# Altium footprint library hphonglib.PcbLib: 1250 footprints (part 73 of 79)
Each footprint in its own frame and in the unit in brackets; x right, y up, seen from the top. Pads: shape width x height; smd on the part's side, far side on the other; paste and mask are expansions set on the pad; w line width, h text height; cw(c..) or ccw(c..) is an arc to the next point about the centre after c.
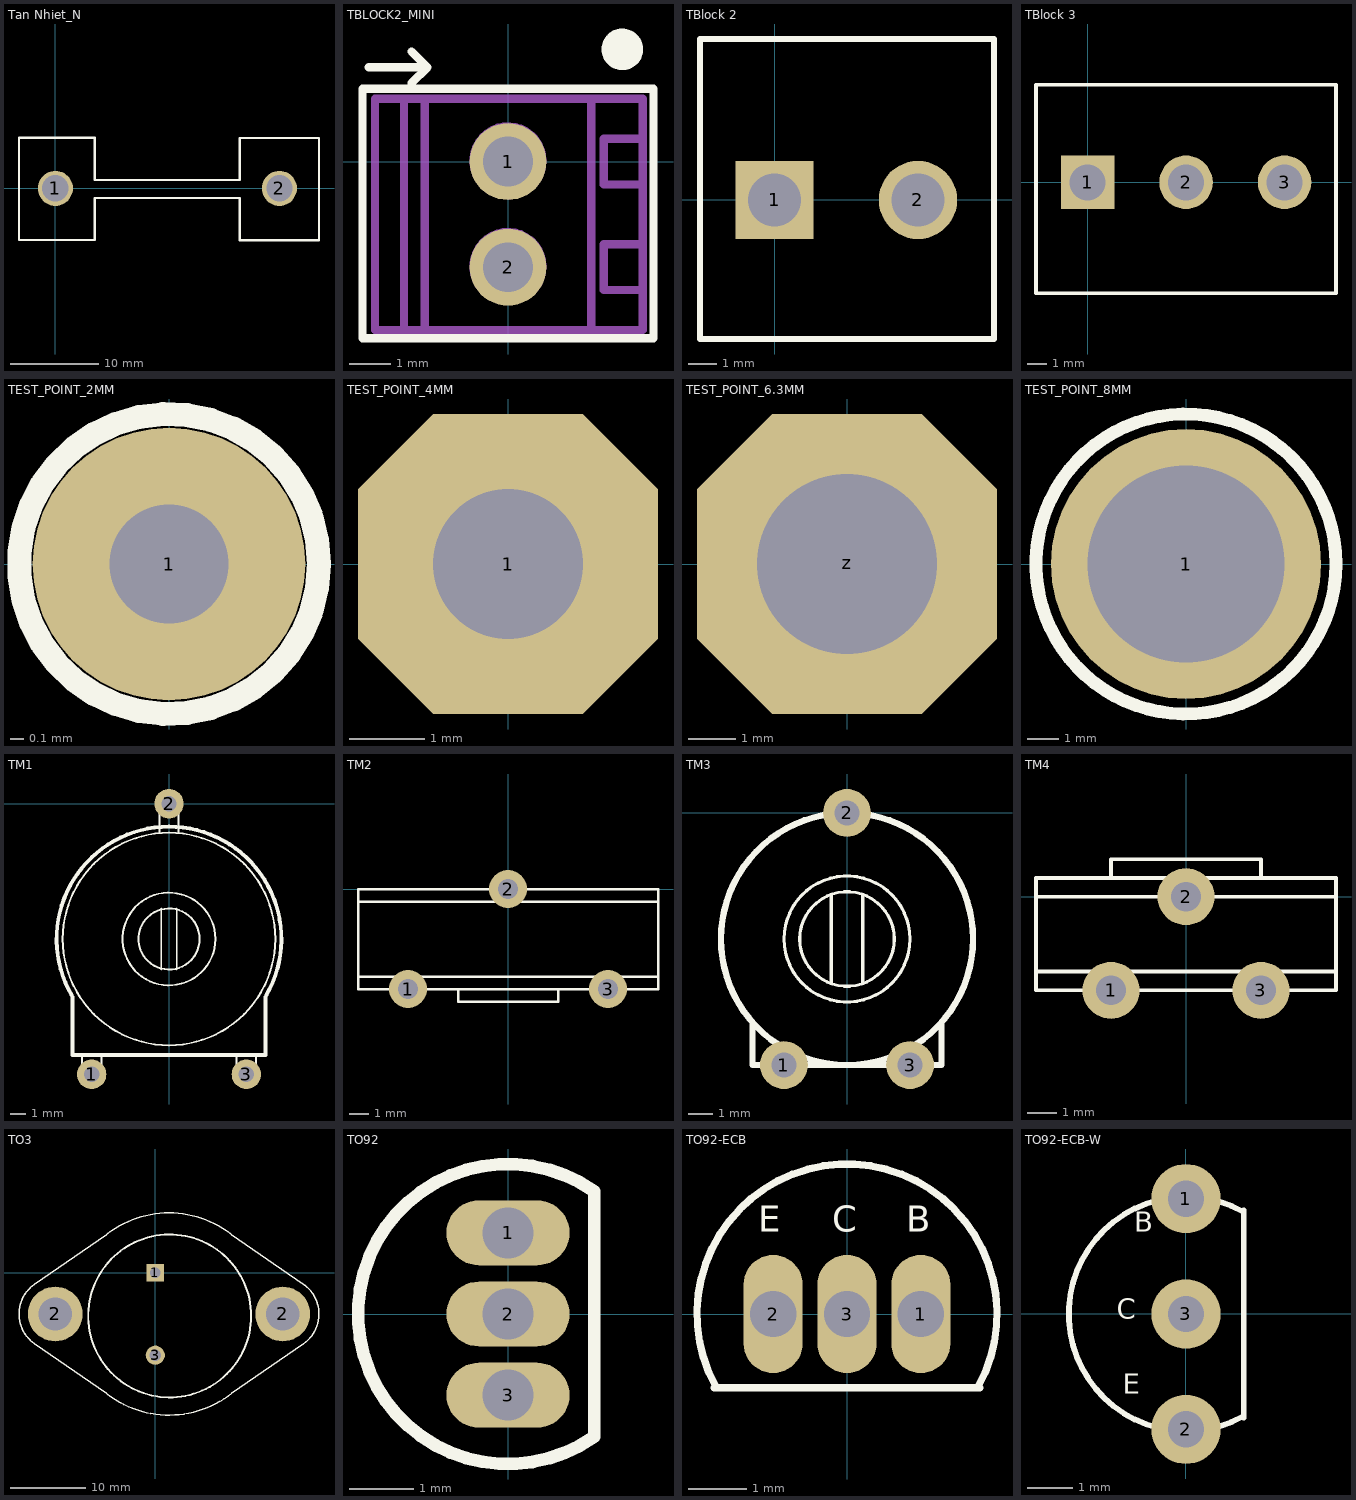
[diagram p72: the footprints below, top view; thin cyan lines are the x and y axes]

## Tan Nhiet_N [mm]
pads (2):
  round 4 hole 3: 1(0,0) 2(25.5,0)
Top Overlay:
  lines w0.254: -4.14,-5.867 4.475,-5.867 4.475,-1.1 20.975,-1.1 20.975,-5.918 30,-5.918 30,5.74 20.975,5.74 20.975,0.95 4.475,0.95 4.475,5.766 -4.14,5.766 -4.14,-5.867
Bottom Overlay:
  circle w0.254: c25.5,0 r1.652
  circle w0.254: c0,0 r1.652
3D body "HeatSink TO220.STEP": height 25, standoff -3.4, extent -4.022,-5.885 29.778,5.715

## TBLOCK2_MINI [mm] "Screw Terminal Strip, 2 Way, 2.54 mm Pitch"
pads (2):
  round 1.85 hole 1.2: 1(0,0) 2(0,-2.54)
Top Overlay:
  circle w0.5: c2.75,2.7 r0.25
  lines w0.2: -3.35,2.27 -1.94,2.27 ; -2.32,1.89 -1.94,2.27 ; -2.32,2.65 -1.94,2.27 ; -3.5,-4.25 3.5,-4.25 3.5,1.75 -3.5,1.75 -3.5,-4.25
Bottom Overlay:
  lines w0.1: -3.48,-4.267 -3.48,1.727 3.48,1.727 3.48,-4.267 -3.48,-4.267
Mechanical 13:
  text ".Designator" at 0.6,-2.925 h2.03
Mechanical 15:
  circle w0.254: c0,0.02 r0.8
  circle w0.254: c0,-2.52 r0.8
  lines w0.2: -2.5,-4.025 -2.5,1.44 ; -2,-4.025 -2,1.5 ; -0.7,-2.1 0.4,-3.2 ; -0.7,0.4 0.3,-0.6 ; -0.2,-1.84 0.7,-2.74 ; -0.2,0.7 0.7,-0.2 ; 2,-4.025 2,1.51 ; 3.2,-3.09 2.3,-3.09 2.3,-1.99 3.2,-1.99 ; 3.2,-0.55 2.3,-0.55 2.3,0.55 3.2,0.55 ; -3.2,1.51 3.24,1.51 3.24,-4.05 -3.198,-4.05 -3.2,1.51
3D body: height 8.5, standoff 4.5, extent -2.7,-4.025 2,1.5
3D body: height 4.5, standoff 0.01, extent -3.2,-4.025 3.25,1.5
3D body: height 2.5, standoff -1, extent -0.55,-3.09 0.55,-1.99
3D body: height 2.5, standoff -1, extent -0.55,-0.55 0.55,0.55
3D body: height 3.5, standoff 1, extent 2.291,-3.284 3.275,-1.774
3D body: height 3.5, standoff 1, extent 2.291,-0.759 3.275,0.751
3D body: height 8.55, standoff 7.6, extent -1.125,-3.565 1.125,-1.515
3D body: height 8.55, standoff 7.6, extent -1.125,-1.025 1.125,1.025
3D body: height 8.6, standoff 7.6, extent 0.129,-3.467 1.029,-1.617
3D body: height 8.6, standoff 7.6, extent -1.021,-3.475 -0.121,-1.625
3D body: height 8.6, standoff 7.6, extent -1.021,-0.925 -0.121,0.925
3D body: height 8.6, standoff 7.6, extent 0.129,-0.917 1.029,0.933

## TBlock 2 [mil] "Connector; Terminal; 2 Positions; Solder Pad 35mil"
pads (2):
  rect 107x107 hole 72: 1(0,0)
  round 107 hole 72: 2(196,0)
Top Overlay:
  lines w7.87: -102,-190 300,-190 300,220 -102,220 -102,-190
3D body "terminal_blocks_a-tb500-ti02.stp": height 560.07, standoff -136.8, extent -121.66,-189 295.67,216.52

## TBlock 3 [mil] "Connector; Terminal; 3 Positions; Solder Pad 35mil"
pads (3):
  rect 107x107 hole 72: 1(0,0)
  round 107 hole 72: 2(197,0) 3(394,0)
Top Overlay:
  lines w7.87: -103,-222 -103,195 497,195 497,-222 -103,-222
3D body "terminal_blocks_a-tb500-ti03.stp": height 120.8, standoff -576.07, extent -98.28,-216 515.9,189.52

## TEST_POINT_2MM [mil] "Test point"
height 150
pads (1):
  round 80 hole 35: 1(0,0)
Top Overlay:
  circle w7: c0,0 r44.01
3D body "socket 1-1.stp": height 178.11, standoff -114.41, extent -50,-50 50,50

## TEST_POINT_4MM [mm] "Test Pad, 1-Pin"
pads (1):
  oct 4x4 hole 2: 1(0,0)

## TEST_POINT_6.3MM [mm] "VIT"
height 0.005
pads (1):
  oct 6.35x6.35 hole 3.81: z(0,0)

## TEST_POINT_8MM [mm] "Jac cap 6ly"
height 3.81
pads (1):
  round 8.5 hole 6.2: 1(0,0)
Top Overlay:
  circle w0.406: c0,0 r4.724

## TM1 [mil]
pads (3):
  round 76 hole 39.37 unplated: 1(-200,-700) 2(0,0) 3(200,-700)
Top Overlay:
  circle w5: c0,-350 r79
  circle w5: c0,-350 r120
  circle w5: c0,-350 r275
  lines w5: -225,-650 -225,-700 -175,-700 -175,-650 ; -25,-75 -25,0 25,0 25,-75 ; -20,-429 -20,-271 ; 20,-429 20,-271 ; 175,-650 175,-700 225,-700 225,-650
  lines w10: -251.79,-495.37 cw(c0,-350) 252.04,-494.93 ; -250,-500 -250,-650 250,-650 250,-500
Bottom Overlay:
  lines w10: -251.79,-495.37 cw(c0,-350) 252.04,-494.93 ; -250,-500 -250,-650 250,-650 250,-500

## TM2 [mil]
pads (3):
  round 76 hole 39.37 unplated: 1(-200,-200) 2(0,0) 3(200,-200)
Top Overlay:
  lines w5: -300,-175 300,-175 ; -300,-25 300,-25 ; -100,-200 -100,-225 100,-225 100,-200 ; -300,-200 -300,0 300,0 300,-200 -300,-200

## TM3 [mil]
pads (3):
  round 76 hole 39.37 unplated: 1(-100,-400) 2(0,0) 3(100,-400)
Top Overlay:
  circle w5: c0,-200 r75
  circle w5: c0,-200 r100
  circle w10: c0,-200 r200
  lines w5: -25,-270 -25,-130 ; 25,-270 25,-130
  lines w10: -150,-335 -150,-400 150,-400 150,-335
Bottom Overlay:
  circle w10: c0,-200 r200
  lines w10: -150,-335 -150,-400 150,-400 150,-335

## TM4 [mil]
pads (3):
  round 76 hole 39.37 unplated: 1(-100,-125) 2(0,0) 3(100,-125)
Top Overlay:
  lines w5: -200,-100 200,-100 ; -200,0 200,0 ; -100,25 -100,50 100,50 100,25 ; -200,-125 200,-125 200,25 -200,25 -200,-125

## TO3 [mm] "Oval Flange Mount with (2) Offset Leads; Pin Spacing 10.92 mm; Lead Dia. 1.09 mm (max)"
height 7.62
pads (4):
  rect 2.3x2.3 hole 1.4: 1(0,0)
  round 7.25 hole 4.4: 2(-13.26,-5.46) 2(16.89,-5.46)
  round 2.54 hole 1.524: 3(0,-10.92)
Top Overlay:
  circle w0.254: c1.905,-5.715 r10.795
  lines w0.2: -16.025,-9.39 -6.484,-15.981 ; -16.025,-1.52 -6.484,5.061 ; -16.013,-9.392 cw(c-13.26,-5.46) -16.013,-1.528 ; -6.798,-15.725 ccw(c1.815,-5.46) 10.113,-15.981 19.635,-9.4 ; -6.798,4.805 cw(c1.815,-5.46) 10.428,4.805 ; 10.114,5.061 19.495,-1.43 ; 19.504,-1.434 cw(c16.89,-5.46) 19.643,-9.392

## TO92 [mil] "TO, Flat Index; 3 In-Line, Axial Leads; Body Dia. 4.6mm; Leads 0.53 x 0.39 mm (max)"
pads (3):
  oval 76x40 hole 31.5: 1(0,50) 2(0,0) 3(0,-50)
Top Overlay:
  lines w7.87: 53.15,-75.59 cw(c0,0) 53.15,75.59 53.15,-75.59
Bottom Overlay:
  lines w7.87: 53.15,-75.59 cw(c0,0) 53.15,75.59 53.15,-75.59
3D body: height 314.96, standoff 157.48, extent -88.58,-88.58 49.21,88.58
3D body: height 196.85, standoff -39.37, extent -11.76,37.4 11.76,60.98
3D body: height 196.85, standoff -39.37, extent -10.78,-11.81 12.75,11.76
3D body: height 196.85, standoff -39.37, extent -11.76,-62.99 11.76,-39.42

## TO92-ECB [mil] "C1815"
pads (3):
  oval 40x80 hole 31.49 unplated: 1(50,0) 2(-50,0) 3(0,0)
Top Overlay:
  lines w5: -90,-50 90,-50 ; -88.94,-49.1 cw(c0,0) 88.94,-49.1
  text "C" at -10,50 h30
  text "B" at 40,50 h30
  text "E" at -60,50 h30
Bottom Overlay:
  lines w5: -90,-50 90,-50 ; -88.94,-49.1 cw(c0,0) 88.94,-49.1
3D body: height 314.96, standoff 157.48, extent -89.57,-48.23 87.6,89.57
3D body: height 196.85, standoff -39.37, extent 36.42,-10.78 59.99,12.75
3D body: height 196.85, standoff -39.37, extent -12.8,-11.76 10.78,11.76
3D body: height 196.85, standoff -39.37, extent -63.98,-10.78 -40.4,12.75

## TO92-ECB-W [mil] "C1815"
pads (3):
  round 60 hole 31.49 unplated: 1(0,100) 2(0,-100) 3(0,0)
Top Overlay:
  lines w5: 49.1,-88.94 cw(c0,0) 49.1,88.94 ; 50,-90 50,90
  text "E" at -55,-75 h30
  text "B" at -45,65 h30
  text "C" at -60,-10 h30
Bottom Overlay:
  lines w5: 49.1,-88.94 cw(c0,0) 49.1,88.94 ; 50,-90 50,90
3D body: height 314.96, standoff 157.48, extent -89.57,-89.57 48.23,87.6
3D body: height 196.85, standoff -39.37, extent -10.83,88.61 12.7,112.18
3D body: height 196.85, standoff -39.37, extent -11.76,-12.8 11.76,10.78
3D body: height 196.85, standoff -39.37, extent -10.83,-111.2 12.7,-87.62